# Altium integrated library LEMO Unipole And Multipole Type Connectors.IntLib: 1566 symbols (part 7 of 13)
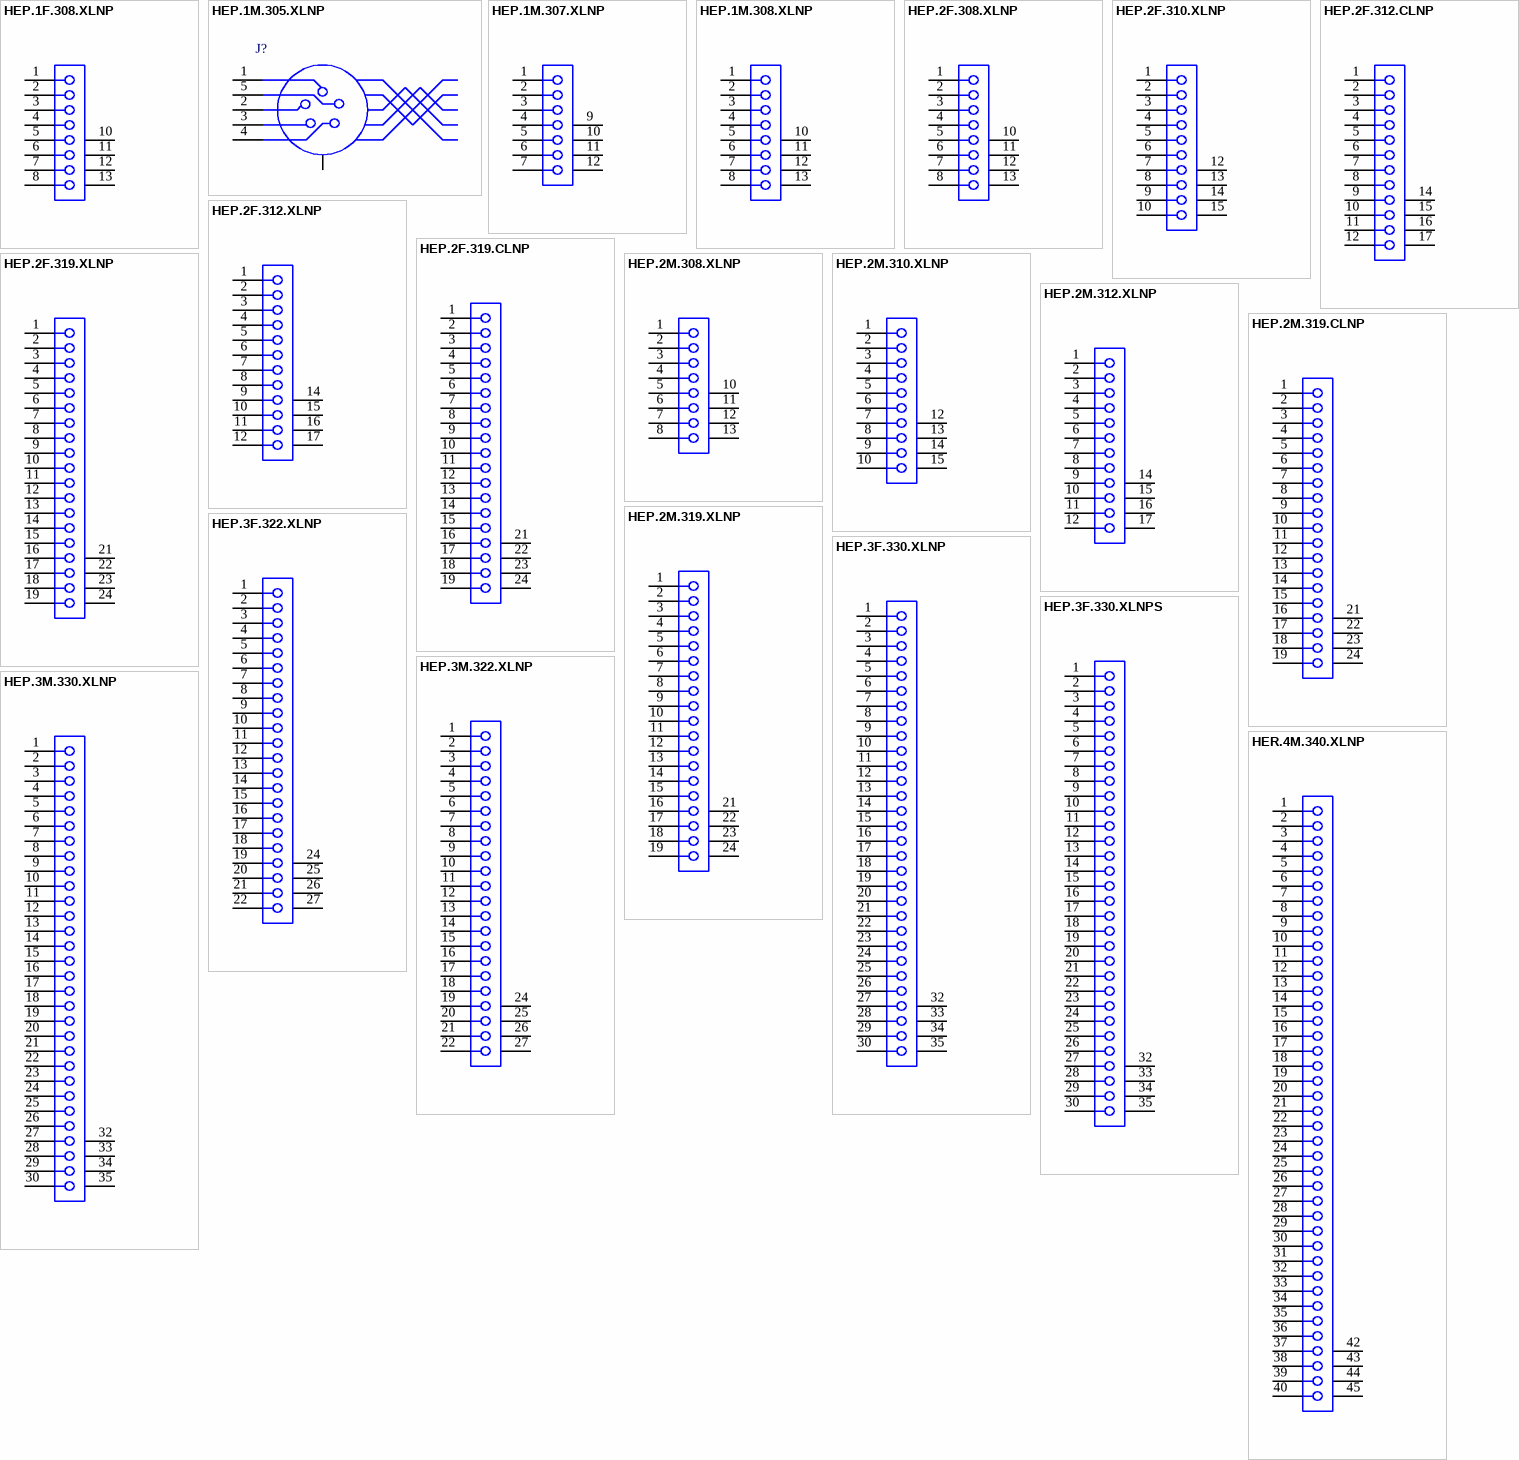
[diagram p49: symbols HEP.1F.308.XLNP to HER.4M.340.XLNP]

## HEP.1M.307.XLNP
designator J?
Fixed receptacle, nut fixing for printed circuit, watertight, Key (P), 1M series, Multipole Type with 7 Contacts; Manufacturer: LEMO; PartNumber: HEP.1M.307.XLNP; Number of contacts: 7; Contact Diameter: 0.7 mm; AWG: 24; DatasheetVersion: Jun-14; PackageReference: HEP.1M.307.XLNP; PackageDescription: Fixed receptacle, nut fixing for printed circuit, watertight, Key(P) for Printed Circuit; Supplier 1: Mouser; Supplier Part Number 1: 736-HEP1M307XLNP; Supplier 2: Digi-Key; Supplier Part Number 2: HEP.1M.307.XLNP-ND; Rated Current(A): 7; ComponentLink1Description: Manufacturer URL; ComponentLink1URL: http://www.lemo.com; ComponentLink2Description: Datasheet; ComponentLink2URL: http://intra.lemo.ch/catalog/ROW/UK_English/M_series.pdf
footprint HEP.1M.307.XLNP (Socket, Female, Body 14mm dia. Height 20.8 mm, Through hole)
pins: 1, 2, 3, 4, 5, 6, 7, 9, 10, 11, 12

## HEP.1M.308.XLNP
designator J?
Fixed receptacle, nut fixing for printed circuit, watertight, Key (P), 1M series, Multipole Type with 8 Contacts; Manufacturer: LEMO; PartNumber: HEP.1M.308.XLNP; Number of contacts: 8; Contact Diameter: 0.7 mm; AWG: 24; Rated Current(A): 5; DatasheetVersion: Jun-14; PackageReference: HEP.1M.308.XLNP; PackageDescription: Fixed receptacle, nut fixing for printed circuit, watertight, Key(P) for Printed Circuit; ComponentLink1Description: Manufacturer URL; ComponentLink1URL: http://www.lemo.com; ComponentLink2Description: Datasheet; ComponentLink2URL: http://intra.lemo.ch/catalog/ROW/UK_English/M_series.pdf
footprint HEP.1M.308.XLNP (Socket, Female, Body 14mm dia. Height 20.8 mm, Through hole)
pins: 1, 2, 3, 4, 5, 6, 7, 8, 10, 11, 12, 13

## HEP.2F.308.XLNP
designator J?
Fixed receptacle, nut fixing, for printed circuit (back panel mounting), Key (P), 2F series, Multipole Type with 8 Contacts; Manufacturer: LEMO; PartNumber: HEP.2F.308.XLNP; Number of contacts: 8; Contact Diameter: 0.9 mm; AWG: 22; Test voltage Contact-Contact(Kv rms): 1.95; Rate Current(A): 10; DatasheetVersion: Jun-14; PackageReference: HEP.2F.308.XLNP; PackageDescription: Fixed receptacle, nut fixing, for printed circuit (back panel mounting), Key(P) for Printed Circuit; Supplier 1: Mouser; Supplier Part Number 1: 736-HEP2F308XLNP; Supplier 2: Digi-Key; Supplier Part Number 2: HEP.2F.308.XLNP-ND; Test voltage Contact-Shell(Kv rms): 1.95; ComponentLink1Description: Manufacturer URL; ComponentLink1URL: http://www.lemo.com; ComponentLink2Description: Datasheet; ComponentLink2URL: http://intra.lemo.ch/catalog/ROW/UK_English/f_series.pdf
footprint HEP.2F.308.XLNP (Socket, Female, Body 16mm dia. Height 21.6 mm, Through hole)
pins: 1, 2, 3, 4, 5, 6, 7, 8, 10, 11, 12, 13

## HEP.2F.310.XLNP
designator J?
Fixed receptacle, nut fixing, for printed circuit (back panel mounting), Key (P), 2F series, Multipole Type with 10 Contacts; Manufacturer: LEMO; PartNumber: HEP.2F.310.XLNP; Number of contacts: 10; Contact Diameter: 0.9 mm; AWG: 22; Test voltage Contact-Contact(Kv rms): 1.8; Test voltage Contact-Shell(Kv rms): 2.1; Rate Current(A): 8; DatasheetVersion: Jun-14; PackageReference: HEP.2F.310.XLNP; PackageDescription: Fixed receptacle, nut fixing, for printed circuit (back panel mounting), Key(P) for Printed Circuit; Supplier 1: Mouser; Supplier Part Number 1: 736-HEP2F310XLNP; Supplier 2: Digi-Key; Supplier Part Number 2: HEP.2F.310.XLNP-ND; ComponentLink1Description: Manufacturer URL; ComponentLink1URL: http://www.lemo.com; ComponentLink2Description: Datasheet; ComponentLink2URL: http://intra.lemo.ch/catalog/ROW/UK_English/f_series.pdf
footprint HEP.2F.310.XLNP (Socket, Female, Body 16mm dia. Height 21.6 mm, Through hole)
pins: 1, 2, 3, 4, 5, 6, 7, 8, 9, 10, 12, 13, 14, 15

## HEP.2F.312.CLNP
designator J?
Fixed receptacle, nut fixing, for printed circuit (back panel mounting), Key (P), 2F series, Multipole Type with 12 Contacts; Manufacturer: LEMO; PartNumber: HEP.2F.312.CLNP; Number of contacts: 12; Contact Diameter: 0.7 mm; AWG: 24; Test voltage Contact-Contact(Kv rms): 1.65; Test voltage Contact-Shell(Kv rms): 2; Rate Current(A): 7; DatasheetVersion: Jun-14; PackageReference: HEP.2F.312.CLNP; PackageDescription: Fixed receptacle, nut fixing, for printed circuit (back panel mounting), Key(P) for Printed Circuit; ComponentLink1Description: Manufacturer URL; ComponentLink1URL: http://www.lemo.com; ComponentLink2Description: Datasheet; ComponentLink2URL: http://intra.lemo.ch/catalog/ROW/UK_English/f_series.pdf
footprint HEP.2F.312.CLNP (Socket, Female, Body 16mm dia. Height 21.6 mm, Through hole)
pins: 1, 2, 3, 4, 5, 6, 7, 8, 9, 10, 11, 12, 14, 15, 16, 17

## HEP.2F.312.XLNP
designator J?
Fixed receptacle, nut fixing, for printed circuit (back panel mounting), Key (P), 2F series, Multipole Type with 12 Contacts; Manufacturer: LEMO; PartNumber: HEP.2F.312.XLNP; Number of contacts: 12; Contact Diameter: 0.7 mm; AWG: 24; Test voltage Contact-Contact(Kv rms): 1.65; Test voltage Contact-Shell(Kv rms): 2; Rate Current(A): 7; DatasheetVersion: Jun-14; PackageReference: HEP.2F.312.XLNP; PackageDescription: Fixed receptacle, nut fixing, for printed circuit (back panel mounting), Key(P) for Printed Circuit; ComponentLink1Description: Manufacturer URL; ComponentLink1URL: http://www.lemo.com; ComponentLink2Description: Datasheet; ComponentLink2URL: http://intra.lemo.ch/catalog/ROW/UK_English/f_series.pdf
footprint HEP.2F.312.XLNP (Socket, Female, Body 16mm dia. Height 21.6 mm, Through hole)
pins: 1, 2, 3, 4, 5, 6, 7, 8, 9, 10, 11, 12, 14, 15, 16, 17

## HEP.2F.319.CLNP
designator J?
Fixed receptacle, nut fixing, for printed circuit (back panel mounting), Key (P), 2F series, Multipole Type with 19 Contacts; Manufacturer: LEMO; PartNumber: HEP.2F.319.CLNP; Number of contacts: 19; Contact Diameter: 0.7 mm; AWG: 24; Test voltage Contact-Contact(Kv rms): 1.55; Test voltage Contact-Shell(Kv rms): 1.65; Rate Current(A): 5; DatasheetVersion: Jun-14; PackageReference: HEP.2F.319.CLNP; PackageDescription: Fixed receptacle, nut fixing, for printed circuit (back panel mounting), Key(P) for Printed Circuit; ComponentLink1Description: Manufacturer URL; ComponentLink1URL: http://www.lemo.com; ComponentLink2Description: Datasheet; ComponentLink2URL: http://intra.lemo.ch/catalog/ROW/UK_English/f_series.pdf
footprint HEP.2F.319.CLNP (Socket, Female, Body 16mm dia. Height 21.6 mm, Through hole)
pins: 1, 2, 3, 4, 5, 6, 7, 8, 9, 10, 11, 12, 13, 14, 15, 16, 17, 18, 19, 21, 22, 23, 24

## HEP.2F.319.XLNP
designator J?
Fixed receptacle, nut fixing, for printed circuit (back panel mounting), Key (P), 2F series, Multipole Type with 19 Contacts; Manufacturer: LEMO; PartNumber: HEP.2F.319.XLNP; Number of contacts: 19; Contact Diameter: 0.7 mm; AWG: 24; Test voltage Contact-Contact(Kv rms): 1.55; Test voltage Contact-Shell(Kv rms): 1.65; Rate Current(A): 5; DatasheetVersion: Jun-14; PackageReference: HEP.2F.319.XLNP; PackageDescription: Fixed receptacle, nut fixing, for printed circuit (back panel mounting), Key(P) for Printed Circuit; Supplier 1: Mouser; Supplier Part Number 1: 736-HEP2F319XLNP; Supplier 2: Digi-Key; Supplier Part Number 2: HEP.2F.319.XLNP-ND; ComponentLink1Description: Manufacturer URL; ComponentLink1URL: http://www.lemo.com; ComponentLink2Description: Datasheet; ComponentLink2URL: http://intra.lemo.ch/catalog/ROW/UK_English/f_series.pdf
footprint HEP.2F.319.XLNP (Socket, Female, Body 16mm dia. Height 21.6 mm, Through hole)
pins: 1, 2, 3, 4, 5, 6, 7, 8, 9, 10, 11, 12, 13, 14, 15, 16, 17, 18, 19, 21, 22, 23, 24

## HEP.2M.308.XLNP
designator J?
Fixed receptacle, nut fixing for printed circuit, watertight, Key (P), 2M series, Multipole Type with 8 Contacts; Manufacturer: LEMO; PartNumber: HEP.2M.308.XLNP; Number of contacts: 8; Contact Diameter: 0.9 mm; AWG: 22; Rated Current(A): 10; DatasheetVersion: Jun-14; PackageReference: HEP.2M.308.XLNP; PackageDescription: Fixed receptacle, nut fixing for printed circuit, watertight, Key(P) for Printed Circuit; ComponentLink1Description: Manufacturer URL; ComponentLink1URL: http://www.lemo.com; ComponentLink2Description: Datasheet; ComponentLink2URL: http://intra.lemo.ch/catalog/ROW/UK_English/M_series.pdf
footprint HEP.2M.308.XLNP (Socket, Female, Body 17mm dia. Height 20.8 mm, Through hole)
pins: 1, 2, 3, 4, 5, 6, 7, 8, 10, 11, 12, 13

## HEP.2M.310.XLNP
designator J?
Fixed receptacle, nut fixing for printed circuit, watertight, Key (P), 2M series, Multipole Type with 10 Contacts; Manufacturer: LEMO; PartNumber: HEP.2M.310.XLNP; Number of contacts: 10; Contact Diameter: 0.9 mm; AWG: 22; Rated Current(A): 8; DatasheetVersion: Jun-14; PackageReference: HEP.2M.310.XLNP; PackageDescription: Fixed receptacle, nut fixing for printed circuit, watertight, Key(P) for Printed Circuit; Supplier 1: Mouser; Supplier Part Number 1: 736-HEP2M310XLNP; Supplier 2: Digi-Key; Supplier Part Number 2: HEP.2M.310.XLNP-ND; ComponentLink1Description: Manufacturer URL; ComponentLink1URL: http://www.lemo.com; ComponentLink2Description: Datasheet; ComponentLink2URL: http://intra.lemo.ch/catalog/ROW/UK_English/M_series.pdf
footprint HEP.2M.310.XLNP (Socket, Female, Body 17mm dia. Height 20.8 mm, Through hole)
pins: 1, 2, 3, 4, 5, 6, 7, 8, 9, 10, 12, 13, 14, 15

## HEP.2M.312.XLNP
designator J?
Fixed receptacle, nut fixing for printed circuit, watertight, Key (P), 2M series, Multipole Type with 12 Contacts; Manufacturer: LEMO; PartNumber: HEP.2M.312.XLNP; Number of contacts: 12; Contact Diameter: 0.7 mm; AWG: 24; Rated Current(A): 7; DatasheetVersion: Jun-14; PackageReference: HEP.2M.312.XLNP; PackageDescription: Fixed receptacle, nut fixing for printed circuit, watertight, Key(P) for Printed Circuit; ComponentLink1Description: Manufacturer URL; ComponentLink1URL: http://www.lemo.com; ComponentLink2Description: Datasheet; ComponentLink2URL: http://intra.lemo.ch/catalog/ROW/UK_English/M_series.pdf
footprint HEP.2M.312.XLNP (Socket, Female, Body 17mm dia. Height 20.8 mm, Through hole)
pins: 1, 2, 3, 4, 5, 6, 7, 8, 9, 10, 11, 12, 14, 15, 16, 17

## HEP.2M.319.CLNP
designator J?
Fixed receptacle, nut fixing for printed circuit, watertight, Key (P), 2M series, Multipole Type with 19 Contacts; Manufacturer: LEMO; PartNumber: HEP.2M.319.CLNP; Number of contacts: 19; Contact Diameter: 0.7 mm; AWG: 24; Rated Current(A): 5; DatasheetVersion: Jun-14; PackageReference: HEP.2M.319.CLNP; PackageDescription: Fixed receptacle, nut fixing for printed circuit, watertight, Key(P) for Printed Circuit; ComponentLink1Description: Manufacturer URL; ComponentLink1URL: http://www.lemo.com; ComponentLink2Description: Datasheet; ComponentLink2URL: http://intra.lemo.ch/catalog/ROW/UK_English/M_series.pdf
footprint HEP.2M.319.CLNP (Socket, Female, Body 17mm dia. Height 20.8 mm, Through hole)
pins: 1, 2, 3, 4, 5, 6, 7, 8, 9, 10, 11, 12, 13, 14, 15, 16, 17, 18, 19, 21, 22, 23, 24

## HEP.2M.319.XLNP
designator J?
Fixed receptacle, nut fixing for printed circuit, watertight, Key (P), 2M series, Multipole Type with 19 Contacts; Manufacturer: LEMO; PartNumber: HEP.2M.319.XLNP; Number of contacts: 19; Contact Diameter: 0.7 mm; AWG: 24; Rated Current(A): 5; DatasheetVersion: Jun-14; PackageReference: HEP.2M.319.XLNP; PackageDescription: Fixed receptacle, nut fixing for printed circuit, watertight, Key(P) for Printed Circuit; Supplier 1: Mouser; Supplier Part Number 1: 736-HEP2M319XLNP; Supplier 2: Newark; Supplier Part Number 2: 96W2351; Supplier 3: Digi-Key; Supplier Part Number 3: HEP.2M.319.XLNP-ND; ComponentLink1Description: Manufacturer URL; ComponentLink1URL: http://www.lemo.com; ComponentLink2Description: Datasheet; ComponentLink2URL: http://intra.lemo.ch/catalog/ROW/UK_English/M_series.pdf
footprint HEP.2M.319.XLNP (Socket, Female, Body 17mm dia. Height 20.8 mm, Through hole)
pins: 1, 2, 3, 4, 5, 6, 7, 8, 9, 10, 11, 12, 13, 14, 15, 16, 17, 18, 19, 21, 22, 23, 24

## HEP.3F.322.XLNP
designator J?
Fixed receptacle, nut fixing, for printed circuit (back panel mounting), Key (P), 3F series, Multipole Type with 22 Contacts; Manufacturer: LEMO; PartNumber: HEP.3F.322.XLNP; Number of contacts: 22; Contact Diameter: 0.7 mm; AWG: 24; Test voltage Contact-Contact(Kv rms): 1.7; Test voltage Contact-Shell(Kv rms): 1.45; Rate Current(A): 5.5; DatasheetVersion: Jun-14; PackageReference: HEP.3F.322.XLNP; PackageDescription: Fixed receptacle, nut fixing, for printed circuit (back panel mounting), Key(P) for Printed Circuit; ComponentLink1Description: Manufacturer URL; ComponentLink1URL: http://www.lemo.com; ComponentLink2Description: Datasheet; ComponentLink2URL: http://intra.lemo.ch/catalog/ROW/UK_English/f_series.pdf
footprint HEP.3F.322.XLNP (Socket, Female, Body 18mm dia. Height 21.6 mm, Through hole)
pins: 1, 2, 3, 4, 5, 6, 7, 8, 9, 10, 11, 12, 13, 14, 15, 16, 17, 18, 19, 20, 21, 22, 24, 25, 26, 27

## HEP.3F.330.XLNP
designator J?
Fixed receptacle, nut fixing, for printed circuit (back panel mounting), Key (P), 3F series, Multipole Type with 30 Contacts; Manufacturer: LEMO; PartNumber: HEP.3F.330.XLNP; Number of contacts: 30; Contact Diameter: 0.7 mm; AWG: 24; Test voltage Contact-Contact(Kv rms): 1.35; Test voltage Contact-Shell(Kv rms): 1.2; Rate Current(A): 3.5; DatasheetVersion: Jun-14; PackageReference: HEP.3F.330.XLNP; PackageDescription: Fixed receptacle, nut fixing, for printed circuit (back panel mounting), Key(P) for Printed Circuit; Supplier 1: Mouser; Supplier Part Number 1: 736-HEP3F330XLNP; Supplier 2: Newark; Supplier Part Number 2: 55T2826; Supplier 3: Digi-Key; Supplier Part Number 3: HEP.3F.330.XLNP-ND; ComponentLink1Description: Manufacturer URL; ComponentLink1URL: http://www.lemo.com; ComponentLink2Description: Datasheet; ComponentLink2URL: http://intra.lemo.ch/catalog/ROW/UK_English/f_series.pdf
footprint HEP.3F.330.XLNP (Socket, Female, Body 18mm dia. Height 21.6 mm, Through hole)
pins: 1, 2, 3, 4, 5, 6, 7, 8, 9, 10, 11, 12, 13, 14, 15, 16, 17, 18, 19, 20, 21, 22, 23, 24, 25, 26, 27, 28, 29, 30, 32, 33, 34, 35

## HEP.3F.330.XLNPS
designator J?
Fixed receptacle, nut fixing, for printed circuit (back panel mounting), Key (P), 3F series, Multipole Type with 30 Contacts; Manufacturer: LEMO; PartNumber: HEP.3F.330.XLNPS; Number of contacts: 30; Contact Diameter: 0.7 mm; AWG: 24; Test voltage Contact-Contact(Kv rms): 1.35; Test voltage Contact-Shell(Kv rms): 1.2; Rate Current(A): 3.5; DatasheetVersion: Jun-14; PackageReference: HEP.3F.330.XLNPS; PackageDescription: Fixed receptacle, nut fixing, for printed circuit (back panel mounting), Key(P) for Printed Circuit; ComponentLink1Description: Manufacturer URL; ComponentLink1URL: http://www.lemo.com; ComponentLink2Description: Datasheet; ComponentLink2URL: http://intra.lemo.ch/catalog/ROW/UK_English/f_series.pdf
footprint HEP.3F.330.XLNPS (Socket, Female, Body 18mm dia. Height 21.6 mm, Through hole)
pins: 1, 2, 3, 4, 5, 6, 7, 8, 9, 10, 11, 12, 13, 14, 15, 16, 17, 18, 19, 20, 21, 22, 23, 24, 25, 26, 27, 28, 29, 30, 32, 33, 34, 35

## HEP.3M.322.XLNP
designator J?
Fixed receptacle, nut fixing for printed circuit, watertight, Key (P), 3M series, Multipole Type with 22 Contacts; Manufacturer: LEMO; PartNumber: HEP.3M.322.XLNP; Number of contacts: 22; Contact Diameter: 0.7 mm; AWG: 24; Rated Current(A): 4; DatasheetVersion: Jun-14; PackageReference: HEP.3M.322.XLNP; PackageDescription: Fixed receptacle, nut fixing for printed circuit, watertight, Key(P) for Printed Circuit; ComponentLink1Description: Manufacturer URL; ComponentLink1URL: http://www.lemo.com; ComponentLink2Description: Datasheet; ComponentLink2URL: http://intra.lemo.ch/catalog/ROW/UK_English/M_series.pdf
footprint HEP.3M.322.XLNP (Socket, Female, Body 19mm dia. Height 20.8 mm, Through hole)
pins: 1, 2, 3, 4, 5, 6, 7, 8, 9, 10, 11, 12, 13, 14, 15, 16, 17, 18, 19, 20, 21, 22, 24, 25, 26, 27

## HEP.3M.330.XLNP
designator J?
Fixed receptacle, nut fixing for printed circuit, watertight, Key (P), 3M series, Multipole Type with 30 Contacts; Manufacturer: LEMO; PartNumber: HEP.3M.330.XLNP; Number of contacts: 30; Contact Diameter: 0.7 mm; AWG: 24; Rated Current(A): 3.5; DatasheetVersion: Jun-14; PackageReference: HEP.3M.330.XLNP; PackageDescription: Fixed receptacle, nut fixing for printed circuit, watertight, Key(P) for Printed Circuit; ComponentLink1Description: Manufacturer URL; ComponentLink1URL: http://www.lemo.com; ComponentLink2Description: Datasheet; ComponentLink2URL: http://intra.lemo.ch/catalog/ROW/UK_English/M_series.pdf
footprint HEP.3M.330.XLNP (Socket, Female, Body 19mm dia. Height 20.8 mm, Through hole)
pins: 1, 2, 3, 4, 5, 6, 7, 8, 9, 10, 11, 12, 13, 14, 15, 16, 17, 18, 19, 20, 21, 22, 23, 24, 25, 26, 27, 28, 29, 30, 32, 33, 34, 35

## HER.4M.340.XLNP
designator J?
Fixed receptacle, nut fixing for printed circuit, watertight, Key (R), 4M series, Multipole Type with 40 Contacts; Manufacturer: LEMO; PartNumber: HER.4M.340.XLNP; Number of contacts: 40; Contact Diameter: 0.7 mm; AWG: 24; Rated Current(A): 3.5; DatasheetVersion: Jun-14; PackageReference: HER.4M.340.XLNP; PackageDescription: Fixed receptacle, nut fixing for printed circuit, watertight, Key(R) for Printed Circuit; ComponentLink1Description: Manufacturer URL; ComponentLink1URL: http://www.lemo.com; ComponentLink2Description: Datasheet; ComponentLink2URL: http://intra.lemo.ch/catalog/ROW/UK_English/M_series.pdf
footprint HER.4M.340.XLNP (Socket, Female, Through hole)
pins: 1, 2, 3, 4, 5, 6, 7, 8, 9, 10, 11, 12, 13, 14, 15, 16, 17, 18, 19, 20, 21, 22, 23, 24, 25, 26, 27, 28, 29, 30, 31, 32, 33, 34, 35, 36, 37, 38, 39, 40, 42, 43, 44, 45

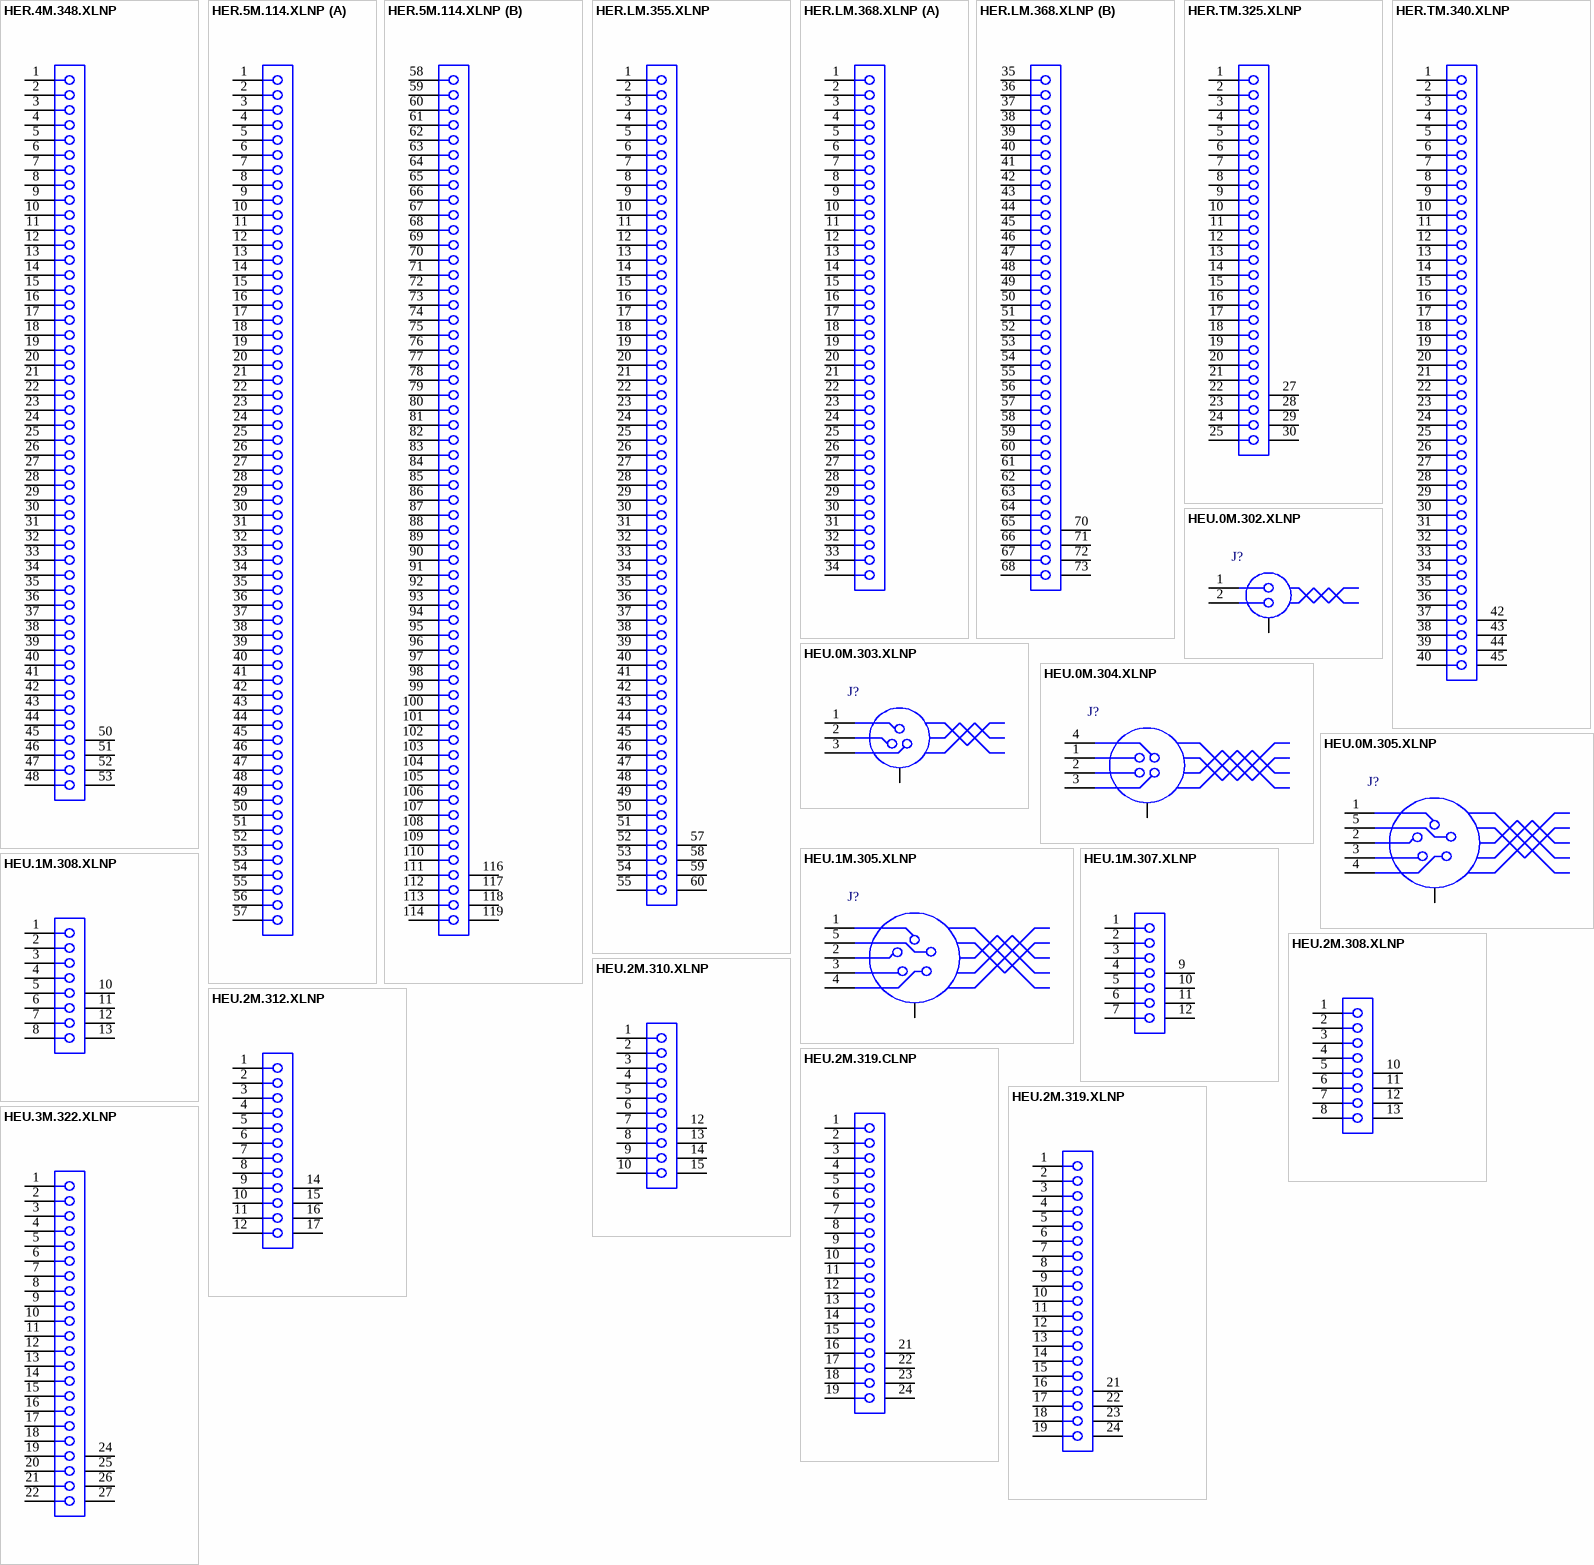
[diagram p21: symbols HER.4M.348.XLNP to HEU.3M.322.XLNP]

## HER.4M.348.XLNP
designator J?
Fixed receptacle, nut fixing for printed circuit, watertight, Key (R), 4M series, Multipole Type with 48 Contacts; Manufacturer: LEMO; PartNumber: HER.4M.348.XLNP; Number of contacts: 48; Contact Diameter: 0.7 mm; AWG: 24; Rated Current(A): 3; DatasheetVersion: Jun-14; PackageReference: HER.4M.348.XLNP; PackageDescription: Fixed receptacle, nut fixing for printed circuit, watertight, Key(R) for Printed Circuit; ComponentLink1Description: Manufacturer URL; ComponentLink1URL: http://www.lemo.com; ComponentLink2Description: Datasheet; ComponentLink2URL: http://intra.lemo.ch/catalog/ROW/UK_English/M_series.pdf
footprint HER.4M.348.XLNP (Socket, Female, Through hole)
pins: 1, 2, 3, 4, 5, 6, 7, 8, 9, 10, 11, 12, 13, 14, 15, 16, 17, 18, 19, 20, 21, 22, 23, 24, 25, 26, 27, 28, 29, 30, 31, 32, 33, 34, 35, 36, 37, 38, 39, 40, 41, 42, 43, 44, 45, 46, 47, 48, 50, 51, 52, 53

## HER.5M.114.XLNP
designator J?
Fixed receptacle, nut fixing for printed circuit, watertight, Key (R), 5M series, Multipole Type with 114 Contacts; Manufacturer: LEMO; PartNumber: HER.5M.114.XLNP; Number of contacts: 114; Contact Diameter: 0.7 mm; AWG: 24; Rated Current(A): 2; DatasheetVersion: Jun-14; PackageReference: HER.5M.114.XLNP; PackageDescription: Fixed receptacle, nut fixing for printed circuit, watertight, Key(R) for Printed Circuit; ComponentLink1Description: Manufacturer URL; ComponentLink1URL: http://www.lemo.com; ComponentLink2Description: Datasheet; ComponentLink2URL: http://intra.lemo.ch/catalog/ROW/UK_English/M_series.pdf
footprint HER.5M.114.XLNP (Socket, Female, Body 33mm dia. Height 24.6 mm, Through hole)
part A pins: 1, 2, 3, 4, 5, 6, 7, 8, 9, 10, 11, 12, 13, 14, 15, 16, 17, 18, 19, 20, 21, 22, 23, 24, 25, 26, 27, 28, 29, 30, 31, 32, 33, 34, 35, 36, 37, 38, 39, 40, 41, 42, 43, 44, 45, 46, 47, 48, 49, 50, 51, 52, 53, 54, 55, 56, 57
part B pins: 58, 59, 60, 61, 62, 63, 64, 65, 66, 67, 68, 69, 70, 71, 72, 73, 74, 75, 76, 77, 78, 79, 80, 81, 82, 83, 84, 85, 86, 87, 88, 89, 90, 91, 92, 93, 94, 95, 96, 97, 98, 99, 100, 101, 102, 103, 104, 105, 106, 107, 108, 109, 110, 111, 112, 113, 114, 116, 117, 118, 119

## HER.LM.355.XLNP
designator J?
Fixed receptacle, nut fixing for printed circuit, watertight, Key (R), LM series, Multipole Type with; Manufacturer: LEMO; PartNumber: HER.LM.355.XLNP; Number of contacts: 0; Contact Diameter: 0.9 mm; Rated Current(A): 3.5; DatasheetVersion: Jun-14; PackageReference: HER.LM.355.XLNP; PackageDescription: Fixed receptacle, nut fixing for printed circuit, watertight, Key(R) for Printed Circuit; ComponentLink1Description: Manufacturer URL; ComponentLink1URL: http://www.lemo.com; ComponentLink2Description: Datasheet; ComponentLink2URL: http://intra.lemo.ch/catalog/ROW/UK_English/M_series.pdf
footprint HER.LM.355.XLNP (Socket, Female, Body 28mm dia. Height 24.6 mm, Through hole)
pins: 1, 2, 3, 4, 5, 6, 7, 8, 9, 10, 11, 12, 13, 14, 15, 16, 17, 18, 19, 20, 21, 22, 23, 24, 25, 26, 27, 28, 29, 30, 31, 32, 33, 34, 35, 36, 37, 38, 39, 40, 41, 42, 43, 44, 45, 46, 47, 48, 49, 50, 51, 52, 53, 54, 55, 57, 58, 59, 60

## HER.LM.368.XLNP
designator J?
Fixed receptacle, nut fixing for printed circuit, watertight, Key (R), LM series, Multipole Type with; Manufacturer: LEMO; PartNumber: HER.LM.368.XLNP; Number of contacts: 0; Contact Diameter: 0.7 mm; AWG: 24; Rated Current(A): 2.5; DatasheetVersion: Jun-14; PackageReference: HER.LM.368.XLNP; PackageDescription: Fixed receptacle, nut fixing for printed circuit, watertight, Key(R) for Printed Circuit; ComponentLink1Description: Manufacturer URL; ComponentLink1URL: http://www.lemo.com; ComponentLink2Description: Datasheet; ComponentLink2URL: http://intra.lemo.ch/catalog/ROW/UK_English/M_series.pdf
footprint HER.LM.368.XLNP (Socket, Female, Body 28mm dia. Height 24.6 mm, Through hole)
part A pins: 1, 2, 3, 4, 5, 6, 7, 8, 9, 10, 11, 12, 13, 14, 15, 16, 17, 18, 19, 20, 21, 22, 23, 24, 25, 26, 27, 28, 29, 30, 31, 32, 33, 34
part B pins: 35, 36, 37, 38, 39, 40, 41, 42, 43, 44, 45, 46, 47, 48, 49, 50, 51, 52, 53, 54, 55, 56, 57, 58, 59, 60, 61, 62, 63, 64, 65, 66, 67, 68, 70, 71, 72, 73

## HER.TM.325.XLNP
designator J?
Fixed receptacle, nut fixing for printed circuit, watertight, Key (R), TM series, Multipole Type with 25 Contacts; Manufacturer: LEMO; PartNumber: HER.TM.325.XLNP; Number of contacts: 25; Contact Diameter: 0.9 mm; Rated Current(A): 5; DatasheetVersion: Jun-14; PackageReference: HER.TM.325.XLNP; PackageDescription: Fixed receptacle, nut fixing for printed circuit, watertight, Key(R) for Printed Circuit; ComponentLink1Description: Manufacturer URL; ComponentLink1URL: http://www.lemo.com; ComponentLink2Description: Datasheet; ComponentLink2URL: http://intra.lemo.ch/catalog/ROW/UK_English/M_series.pdf
footprint HER.TM.325.XLNP (Socket, Female, Body 22mm dia. Height 24.6 mm, Through hole)
pins: 1, 2, 3, 4, 5, 6, 7, 8, 9, 10, 11, 12, 13, 14, 15, 16, 17, 18, 19, 20, 21, 22, 23, 24, 25, 27, 28, 29, 30

## HER.TM.340.XLNP
designator J?
Fixed receptacle, nut fixing for printed circuit, watertight, Key (R), TM series, Multipole Type with 40 Contacts; Manufacturer: LEMO; PartNumber: HER.TM.340.XLNP; Number of contacts: 40; Contact Diameter: 0.7 mm; Rated Current(A): 3; DatasheetVersion: Jun-14; PackageReference: HER.TM.340.XLNP; PackageDescription: Fixed receptacle, nut fixing for printed circuit, watertight, Key(R) for Printed Circuit; ComponentLink1Description: Manufacturer URL; ComponentLink1URL: http://www.lemo.com; ComponentLink2Description: Datasheet; ComponentLink2URL: http://intra.lemo.ch/catalog/ROW/UK_English/M_series.pdf
footprint HER.TM.340.XLNP (Socket, Female, Body 22mm dia. Height 24.6 mm, Through hole)
pins: 1, 2, 3, 4, 5, 6, 7, 8, 9, 10, 11, 12, 13, 14, 15, 16, 17, 18, 19, 20, 21, 22, 23, 24, 25, 26, 27, 28, 29, 30, 31, 32, 33, 34, 35, 36, 37, 38, 39, 40, 42, 43, 44, 45

## HEU.0M.302.XLNP
designator J?
Fixed receptacle, nut fixing for printed circuit, watertight, Key (U), 0M series, Multipole Type with 2 Contacts; Manufacturer: LEMO; PartNumber: HEU.0M.302.XLNP; Number of contacts: 2; Contact Diameter: 0.9 mm; AWG: 22; Rated Current(A): 10; DatasheetVersion: Jun-14; PackageReference: HEU.0M.302.XLNP; PackageDescription: Fixed receptacle, nut fixing for printed circuit, watertight, Key(U) for Printed Circuit; ComponentLink1Description: Manufacturer URL; ComponentLink1URL: http://www.lemo.com; ComponentLink2Description: Datasheet; ComponentLink2URL: http://intra.lemo.ch/catalog/ROW/UK_English/M_series.pdf
footprint HEU.0M.302.XLNP (Socket, Female, Body 13mm dia. Height 20.8 mm, Through hole)
pins: 1, 2, 4, 5, 6, 7

## HEU.0M.303.XLNP
designator J?
Fixed receptacle, nut fixing for printed circuit, watertight, Key (U), 0M series, Multipole Type with 3 Contacts; Manufacturer: LEMO; PartNumber: HEU.0M.303.XLNP; Number of contacts: 3; Contact Diameter: 0.9 mm; AWG: 22; Rated Current(A): 8; DatasheetVersion: Jun-14; PackageReference: HEU.0M.303.XLNP; PackageDescription: Fixed receptacle, nut fixing for printed circuit, watertight, Key(U) for Printed Circuit; ComponentLink1Description: Manufacturer URL; ComponentLink1URL: http://www.lemo.com; ComponentLink2Description: Datasheet; ComponentLink2URL: http://intra.lemo.ch/catalog/ROW/UK_English/M_series.pdf
footprint HEU.0M.303.XLNP (Socket, Female, Body 13mm dia. Height 20.8 mm, Through hole)
pins: 1, 2, 3, 5, 6, 7, 8

## HEU.0M.304.XLNP
designator J?
Fixed receptacle, nut fixing for printed circuit, watertight, Key (U), 0M series, Multipole Type with 4 Contacts; Manufacturer: LEMO; PartNumber: HEU.0M.304.XLNP; Number of contacts: 4; Contact Diameter: 0.7 mm; AWG: 24; Rated Current(A): 7; DatasheetVersion: Jun-14; PackageReference: HEU.0M.304.XLNP; PackageDescription: Fixed receptacle, nut fixing for printed circuit, watertight, Key(U) for Printed Circuit; ComponentLink1Description: Manufacturer URL; ComponentLink1URL: http://www.lemo.com; ComponentLink2Description: Datasheet; ComponentLink2URL: http://intra.lemo.ch/catalog/ROW/UK_English/M_series.pdf
footprint HEU.0M.304.XLNP (Socket, Female, Body 13mm dia. Height 20.8 mm, Through hole)
pins: 1, 2, 3, 4, 6, 7, 8, 9

## HEU.0M.305.XLNP
designator J?
Fixed receptacle, nut fixing for printed circuit, watertight, Key (U), 0M series, Multipole Type with 5 Contacts; Manufacturer: LEMO; PartNumber: HEU.0M.305.XLNP; Number of contacts: 5; Contact Diameter: 0.7 mm; AWG: 24; Rated Current(A): 6.5; DatasheetVersion: Jun-14; PackageReference: HEU.0M.305.XLNP; PackageDescription: Fixed receptacle, nut fixing for printed circuit, watertight, Key(U) for Printed Circuit; ComponentLink1Description: Manufacturer URL; ComponentLink1URL: http://www.lemo.com; ComponentLink2Description: Datasheet; ComponentLink2URL: http://intra.lemo.ch/catalog/ROW/UK_English/M_series.pdf
footprint HEU.0M.305.XLNP (Socket, Female, Body 13mm dia. Height 20.8 mm, Through hole)
pins: 1, 2, 3, 4, 5, 7, 8, 9, 10

## HEU.1M.305.XLNP
designator J?
Fixed receptacle, nut fixing for printed circuit, watertight, Key (U), 1M series, Multipole Type with 5 Contacts; Manufacturer: LEMO; PartNumber: HEU.1M.305.XLNP; Number of contacts: 5; Contact Diameter: 0.9 mm; AWG: 22; Rated Current(A): 9; DatasheetVersion: Jun-14; PackageReference: HEU.1M.305.XLNP; PackageDescription: Fixed receptacle, nut fixing for printed circuit, watertight, Key(U) for Printed Circuit; ComponentLink1Description: Manufacturer URL; ComponentLink1URL: http://www.lemo.com; ComponentLink2Description: Datasheet; ComponentLink2URL: http://intra.lemo.ch/catalog/ROW/UK_English/M_series.pdf
footprint HEU.1M.305.XLNP (Socket, Female, Body 14mm dia. Height 20.8 mm, Through hole)
pins: 1, 2, 3, 4, 5, 7, 8, 9, 10

## HEU.1M.307.XLNP
designator J?
Fixed receptacle, nut fixing for printed circuit, watertight, Key (U), 1M series, Multipole Type with 7 Contacts; Manufacturer: LEMO; PartNumber: HEU.1M.307.XLNP; Number of contacts: 7; Contact Diameter: 0.7 mm; AWG: 24; DatasheetVersion: Jun-14; PackageReference: HEU.1M.307.XLNP; PackageDescription: Fixed receptacle, nut fixing for printed circuit, watertight, Key(U) for Printed Circuit; Rated Current(A): 7; ComponentLink1Description: Manufacturer URL; ComponentLink1URL: http://www.lemo.com; ComponentLink2Description: Datasheet; ComponentLink2URL: http://intra.lemo.ch/catalog/ROW/UK_English/M_series.pdf
footprint HEU.1M.307.XLNP (Socket, Female, Body 14mm dia. Height 20.8 mm, Through hole)
pins: 1, 2, 3, 4, 5, 6, 7, 9, 10, 11, 12

## HEU.1M.308.XLNP
designator J?
Fixed receptacle, nut fixing for printed circuit, watertight, Key (U), 1M series, Multipole Type with 8 Contacts; Manufacturer: LEMO; PartNumber: HEU.1M.308.XLNP; Number of contacts: 8; Contact Diameter: 0.7 mm; AWG: 24; Rated Current(A): 5; DatasheetVersion: Jun-14; PackageReference: HEU.1M.308.XLNP; PackageDescription: Fixed receptacle, nut fixing for printed circuit, watertight, Key(U) for Printed Circuit; ComponentLink1Description: Manufacturer URL; ComponentLink1URL: http://www.lemo.com; ComponentLink2Description: Datasheet; ComponentLink2URL: http://intra.lemo.ch/catalog/ROW/UK_English/M_series.pdf
footprint HEU.1M.308.XLNP (Socket, Female, Body 14mm dia. Height 20.8 mm, Through hole)
pins: 1, 2, 3, 4, 5, 6, 7, 8, 10, 11, 12, 13

## HEU.2M.308.XLNP
designator J?
Fixed receptacle, nut fixing for printed circuit, watertight, Key (U), 2M series, Multipole Type with 8 Contacts; Manufacturer: LEMO; PartNumber: HEU.2M.308.XLNP; Number of contacts: 8; Contact Diameter: 0.9 mm; AWG: 22; Rated Current(A): 10; DatasheetVersion: Jun-14; PackageReference: HEU.2M.308.XLNP; PackageDescription: Fixed receptacle, nut fixing for printed circuit, watertight, Key(U) for Printed Circuit; ComponentLink1Description: Manufacturer URL; ComponentLink1URL: http://www.lemo.com; ComponentLink2Description: Datasheet; ComponentLink2URL: http://intra.lemo.ch/catalog/ROW/UK_English/M_series.pdf
footprint HEU.2M.308.XLNP (Socket, Female, Body 17mm dia. Height 20.8 mm, Through hole)
pins: 1, 2, 3, 4, 5, 6, 7, 8, 10, 11, 12, 13

## HEU.2M.310.XLNP
designator J?
Fixed receptacle, nut fixing for printed circuit, watertight, Key (U), 2M series, Multipole Type with 10 Contacts; Manufacturer: LEMO; PartNumber: HEU.2M.310.XLNP; Number of contacts: 10; Contact Diameter: 0.9 mm; AWG: 22; Rated Current(A): 8; DatasheetVersion: Jun-14; PackageReference: HEU.2M.310.XLNP; PackageDescription: Fixed receptacle, nut fixing for printed circuit, watertight, Key(U) for Printed Circuit; ComponentLink1Description: Manufacturer URL; ComponentLink1URL: http://www.lemo.com; ComponentLink2Description: Datasheet; ComponentLink2URL: http://intra.lemo.ch/catalog/ROW/UK_English/M_series.pdf
footprint HEU.2M.310.XLNP (Socket, Female, Body 17mm dia. Height 20.8 mm, Through hole)
pins: 1, 2, 3, 4, 5, 6, 7, 8, 9, 10, 12, 13, 14, 15

## HEU.2M.312.XLNP
designator J?
Fixed receptacle, nut fixing for printed circuit, watertight, Key (U), 2M series, Multipole Type with 12 Contacts; Manufacturer: LEMO; PartNumber: HEU.2M.312.XLNP; Number of contacts: 12; Contact Diameter: 0.7 mm; AWG: 24; Rated Current(A): 7; DatasheetVersion: Jun-14; PackageReference: HEU.2M.312.XLNP; PackageDescription: Fixed receptacle, nut fixing for printed circuit, watertight, Key(U) for Printed Circuit; ComponentLink1Description: Manufacturer URL; ComponentLink1URL: http://www.lemo.com; ComponentLink2Description: Datasheet; ComponentLink2URL: http://intra.lemo.ch/catalog/ROW/UK_English/M_series.pdf
footprint HEU.2M.312.XLNP (Socket, Female, Body 17mm dia. Height 20.8 mm, Through hole)
pins: 1, 2, 3, 4, 5, 6, 7, 8, 9, 10, 11, 12, 14, 15, 16, 17

## HEU.2M.319.CLNP
designator J?
Fixed receptacle, nut fixing for printed circuit, watertight, Key (U), 2M series, Multipole Type with 19 Contacts; Manufacturer: LEMO; PartNumber: HEU.2M.319.CLNP; Number of contacts: 19; Contact Diameter: 0.7 mm; AWG: 24; Rated Current(A): 5; DatasheetVersion: Jun-14; PackageReference: HEU.2M.319.CLNP; PackageDescription: Fixed receptacle, nut fixing for printed circuit, watertight, Key(U) for Printed Circuit; ComponentLink1Description: Manufacturer URL; ComponentLink1URL: http://www.lemo.com; ComponentLink2Description: Datasheet; ComponentLink2URL: http://intra.lemo.ch/catalog/ROW/UK_English/M_series.pdf
footprint HEU.2M.319.CLNP (Socket, Female, Body 17mm dia. Height 20.8 mm, Through hole)
pins: 1, 2, 3, 4, 5, 6, 7, 8, 9, 10, 11, 12, 13, 14, 15, 16, 17, 18, 19, 21, 22, 23, 24

## HEU.2M.319.XLNP
designator J?
Fixed receptacle, nut fixing for printed circuit, watertight, Key (U), 2M series, Multipole Type with 19 Contacts; Manufacturer: LEMO; PartNumber: HEU.2M.319.XLNP; Number of contacts: 19; Contact Diameter: 0.7 mm; AWG: 24; Rated Current(A): 5; DatasheetVersion: Jun-14; PackageReference: HEU.2M.319.XLNP; PackageDescription: Fixed receptacle, nut fixing for printed circuit, watertight, Key(U) for Printed Circuit; Supplier 1: Mouser; Supplier Part Number 1: 736-HEU2M319XLNP; ComponentLink1Description: Manufacturer URL; ComponentLink1URL: http://www.lemo.com; ComponentLink2Description: Datasheet; ComponentLink2URL: http://intra.lemo.ch/catalog/ROW/UK_English/M_series.pdf
footprint HEU.2M.319.XLNP (Socket, Female, Body 17mm dia. Height 20.8 mm, Through hole)
pins: 1, 2, 3, 4, 5, 6, 7, 8, 9, 10, 11, 12, 13, 14, 15, 16, 17, 18, 19, 21, 22, 23, 24

## HEU.3M.322.XLNP
designator J?
Fixed receptacle, nut fixing for printed circuit, watertight, Key (U), 3M series, Multipole Type with 22 Contacts; Manufacturer: LEMO; PartNumber: HEU.3M.322.XLNP; Number of contacts: 22; Contact Diameter: 0.7 mm; AWG: 24; Rated Current(A): 4; DatasheetVersion: Jun-14; PackageReference: HEU.3M.322.XLNP; PackageDescription: Fixed receptacle, nut fixing for printed circuit, watertight, Key(U) for Printed Circuit; ComponentLink1Description: Manufacturer URL; ComponentLink1URL: http://www.lemo.com; ComponentLink2Description: Datasheet; ComponentLink2URL: http://intra.lemo.ch/catalog/ROW/UK_English/M_series.pdf
footprint HEU.3M.322.XLNP (Socket, Female, Body 19mm dia. Height 20.8 mm, Through hole)
pins: 1, 2, 3, 4, 5, 6, 7, 8, 9, 10, 11, 12, 13, 14, 15, 16, 17, 18, 19, 20, 21, 22, 24, 25, 26, 27

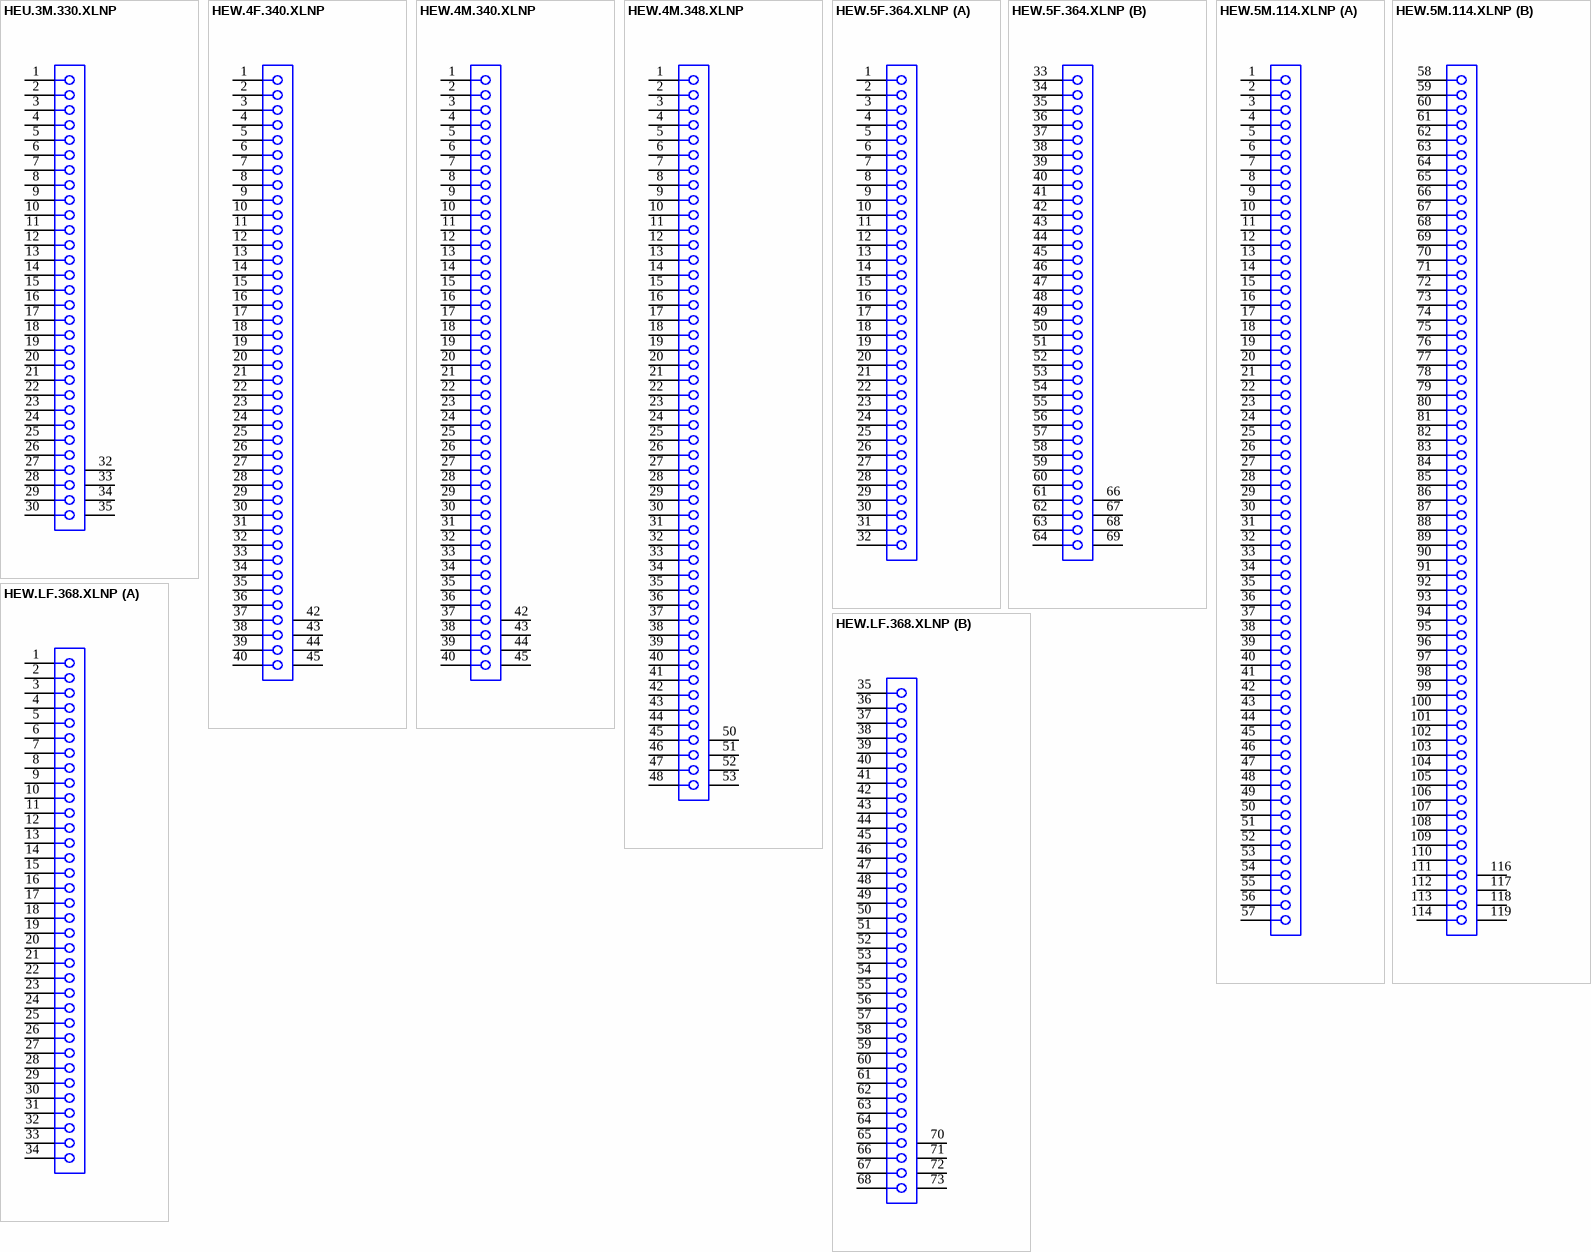
[diagram p22: symbols HEU.3M.330.XLNP to HEW.LF.368.XLNP]

## HEU.3M.330.XLNP
designator J?
Fixed receptacle, nut fixing for printed circuit, watertight, Key (U), 3M series, Multipole Type with 30 Contacts; Manufacturer: LEMO; PartNumber: HEU.3M.330.XLNP; Number of contacts: 30; Contact Diameter: 0.7 mm; AWG: 24; Rated Current(A): 3.5; DatasheetVersion: Jun-14; PackageReference: HEU.3M.330.XLNP; PackageDescription: Fixed receptacle, nut fixing for printed circuit, watertight, Key(U) for Printed Circuit; ComponentLink1Description: Manufacturer URL; ComponentLink1URL: http://www.lemo.com; ComponentLink2Description: Datasheet; ComponentLink2URL: http://intra.lemo.ch/catalog/ROW/UK_English/M_series.pdf
footprint HEU.3M.330.XLNP (Socket, Female, Body 19mm dia. Height 20.8 mm, Through hole)
pins: 1, 2, 3, 4, 5, 6, 7, 8, 9, 10, 11, 12, 13, 14, 15, 16, 17, 18, 19, 20, 21, 22, 23, 24, 25, 26, 27, 28, 29, 30, 32, 33, 34, 35

## HEW.4F.340.XLNP
designator J?
Fixed receptacle, nut fixing, for printed circuit (back panel mounting), Key (W), 4F series, Multipole Type with 40 Contacts; Manufacturer: LEMO; PartNumber: HEW.4F.340.XLNP; Number of contacts: 40; Contact Diameter: 0.7 mm; AWG: 24; Test voltage Contact-Contact(Kv rms): 1.35; Test voltage Contact-Shell(Kv rms): 1.3; Rate Current(A): 2; DatasheetVersion: Jun-14; PackageReference: HEW.4F.340.XLNP; PackageDescription: Fixed receptacle, nut fixing, for printed circuit (back panel mounting), Key(W) for Printed Circuit; Supplier 1: Mouser; Supplier Part Number 1: 736-HEW4F340XLNP; Supplier 2: Digi-Key; Supplier Part Number 2: HEW.4F.340.XLNP-ND; ComponentLink1Description: Manufacturer URL; ComponentLink1URL: http://www.lemo.com; ComponentLink2Description: Datasheet; ComponentLink2URL: http://intra.lemo.ch/catalog/ROW/UK_English/f_series.pdf
footprint HEW.4F.340.XLNP (Socket, Female, Body 24mm dia. Height 22.8 mm, Through hole)
pins: 1, 2, 3, 4, 5, 6, 7, 8, 9, 10, 11, 12, 13, 14, 15, 16, 17, 18, 19, 20, 21, 22, 23, 24, 25, 26, 27, 28, 29, 30, 31, 32, 33, 34, 35, 36, 37, 38, 39, 40, 42, 43, 44, 45

## HEW.4M.340.XLNP
designator J?
Fixed receptacle, nut fixing for printed circuit, watertight, Key (W), 4M series, Multipole Type with 40 Contacts; Manufacturer: LEMO; PartNumber: HEW.4M.340.XLNP; Number of contacts: 40; Contact Diameter: 0.7 mm; AWG: 24; Rated Current(A): 3.5; DatasheetVersion: Jun-14; PackageReference: HEW.4M.340.XLNP; PackageDescription: Fixed receptacle, nut fixing for printed circuit, watertight, Key(W) for Printed Circuit; Supplier 1: Mouser; Supplier Part Number 1: 736-HEW4M340XLNP; Supplier 2: Digi-Key; Supplier Part Number 2: HEW.4M.340.XLNP-ND; ComponentLink1Description: Manufacturer URL; ComponentLink1URL: http://www.lemo.com; ComponentLink2Description: Datasheet; ComponentLink2URL: http://intra.lemo.ch/catalog/ROW/UK_English/M_series.pdf
footprint HEW.4M.340.XLNP (Socket, Female, Through hole)
pins: 1, 2, 3, 4, 5, 6, 7, 8, 9, 10, 11, 12, 13, 14, 15, 16, 17, 18, 19, 20, 21, 22, 23, 24, 25, 26, 27, 28, 29, 30, 31, 32, 33, 34, 35, 36, 37, 38, 39, 40, 42, 43, 44, 45

## HEW.4M.348.XLNP
designator J?
Fixed receptacle, nut fixing for printed circuit, watertight, Key (W), 4M series, Multipole Type with 48 Contacts; Manufacturer: LEMO; PartNumber: HEW.4M.348.XLNP; Number of contacts: 48; Contact Diameter: 0.7 mm; AWG: 24; Rated Current(A): 3; DatasheetVersion: Jun-14; PackageReference: HEW.4M.348.XLNP; PackageDescription: Fixed receptacle, nut fixing for printed circuit, watertight, Key(W) for Printed Circuit; Supplier 1: Mouser; Supplier Part Number 1: 736-HEW4M348XLNP; Supplier 2: Digi-Key; Supplier Part Number 2: HEW.4M.348.XLNP-ND; ComponentLink1Description: Manufacturer URL; ComponentLink1URL: http://www.lemo.com; ComponentLink2Description: Datasheet; ComponentLink2URL: http://intra.lemo.ch/catalog/ROW/UK_English/M_series.pdf
footprint HEW.4M.348.XLNP (Socket, Female, Through hole)
pins: 1, 2, 3, 4, 5, 6, 7, 8, 9, 10, 11, 12, 13, 14, 15, 16, 17, 18, 19, 20, 21, 22, 23, 24, 25, 26, 27, 28, 29, 30, 31, 32, 33, 34, 35, 36, 37, 38, 39, 40, 41, 42, 43, 44, 45, 46, 47, 48, 50, 51, 52, 53

## HEW.5F.364.XLNP
designator J?
Fixed receptacle, nut fixing, for printed circuit (back panel mounting), Key (W), 5F series, Multipole Type with 64 Contacts; Manufacturer: LEMO; PartNumber: HEW.5F.364.XLNP; Number of contacts: 64; Contact Diameter: 0.9 mm; Test voltage Contact-Contact(Kv rms): 1.35; Test voltage Contact-Shell(Kv rms): 1.85; Rate Current(A): 3; DatasheetVersion: Jun-14; PackageReference: HEW.5F.364.XLNP; PackageDescription: Fixed receptacle, nut fixing, for printed circuit (back panel mounting), Key(W) for Printed Circuit; ComponentLink1Description: Manufacturer URL; ComponentLink1URL: http://www.lemo.com; ComponentLink2Description: Datasheet; ComponentLink2URL: http://intra.lemo.ch/catalog/ROW/UK_English/f_series.pdf
footprint HEW.5F.364.XLNP (Socket, Female, Body 33mm dia. Height 30.4 mm, Through hole)
part A pins: 1, 2, 3, 4, 5, 6, 7, 8, 9, 10, 11, 12, 13, 14, 15, 16, 17, 18, 19, 20, 21, 22, 23, 24, 25, 26, 27, 28, 29, 30, 31, 32
part B pins: 33, 34, 35, 36, 37, 38, 39, 40, 41, 42, 43, 44, 45, 46, 47, 48, 49, 50, 51, 52, 53, 54, 55, 56, 57, 58, 59, 60, 61, 62, 63, 64, 66, 67, 68, 69

## HEW.5M.114.XLNP
designator J?
Fixed receptacle, nut fixing for printed circuit, watertight, Key (W), 5M series, Multipole Type with 114 Contacts; Manufacturer: LEMO; PartNumber: HEW.5M.114.XLNP; Number of contacts: 114; Contact Diameter: 0.7 mm; AWG: 24; Rated Current(A): 2; DatasheetVersion: Jun-14; PackageReference: HEW.5M.114.XLNP; PackageDescription: Fixed receptacle, nut fixing for printed circuit, watertight, Key(W) for Printed Circuit; Supplier 1: Mouser; Supplier Part Number 1: 736-HEW5M114XLNP; Supplier 2: Digi-Key; Supplier Part Number 2: 1124-1200-ND; ComponentLink1Description: Manufacturer URL; ComponentLink1URL: http://www.lemo.com; ComponentLink2Description: Datasheet; ComponentLink2URL: http://intra.lemo.ch/catalog/ROW/UK_English/M_series.pdf
footprint HEW.5M.114.XLNP (Socket, Female, Body 33mm dia. Height 24.6 mm, Through hole)
part A pins: 1, 2, 3, 4, 5, 6, 7, 8, 9, 10, 11, 12, 13, 14, 15, 16, 17, 18, 19, 20, 21, 22, 23, 24, 25, 26, 27, 28, 29, 30, 31, 32, 33, 34, 35, 36, 37, 38, 39, 40, 41, 42, 43, 44, 45, 46, 47, 48, 49, 50, 51, 52, 53, 54, 55, 56, 57
part B pins: 58, 59, 60, 61, 62, 63, 64, 65, 66, 67, 68, 69, 70, 71, 72, 73, 74, 75, 76, 77, 78, 79, 80, 81, 82, 83, 84, 85, 86, 87, 88, 89, 90, 91, 92, 93, 94, 95, 96, 97, 98, 99, 100, 101, 102, 103, 104, 105, 106, 107, 108, 109, 110, 111, 112, 113, 114, 116, 117, 118, 119
